# Altium footprint library Miscellaneous Base.PcbLib: 153 footprints (part 1 of 10)
Each footprint in its own frame and in the unit in brackets; x right, y up, seen from the top. Pads: shape width x height; smd on the part's side, far side on the other; paste and mask are expansions set on the pad; w line width, h text height; cw(c..) or ccw(c..) is an arc to the next point about the centre after c.
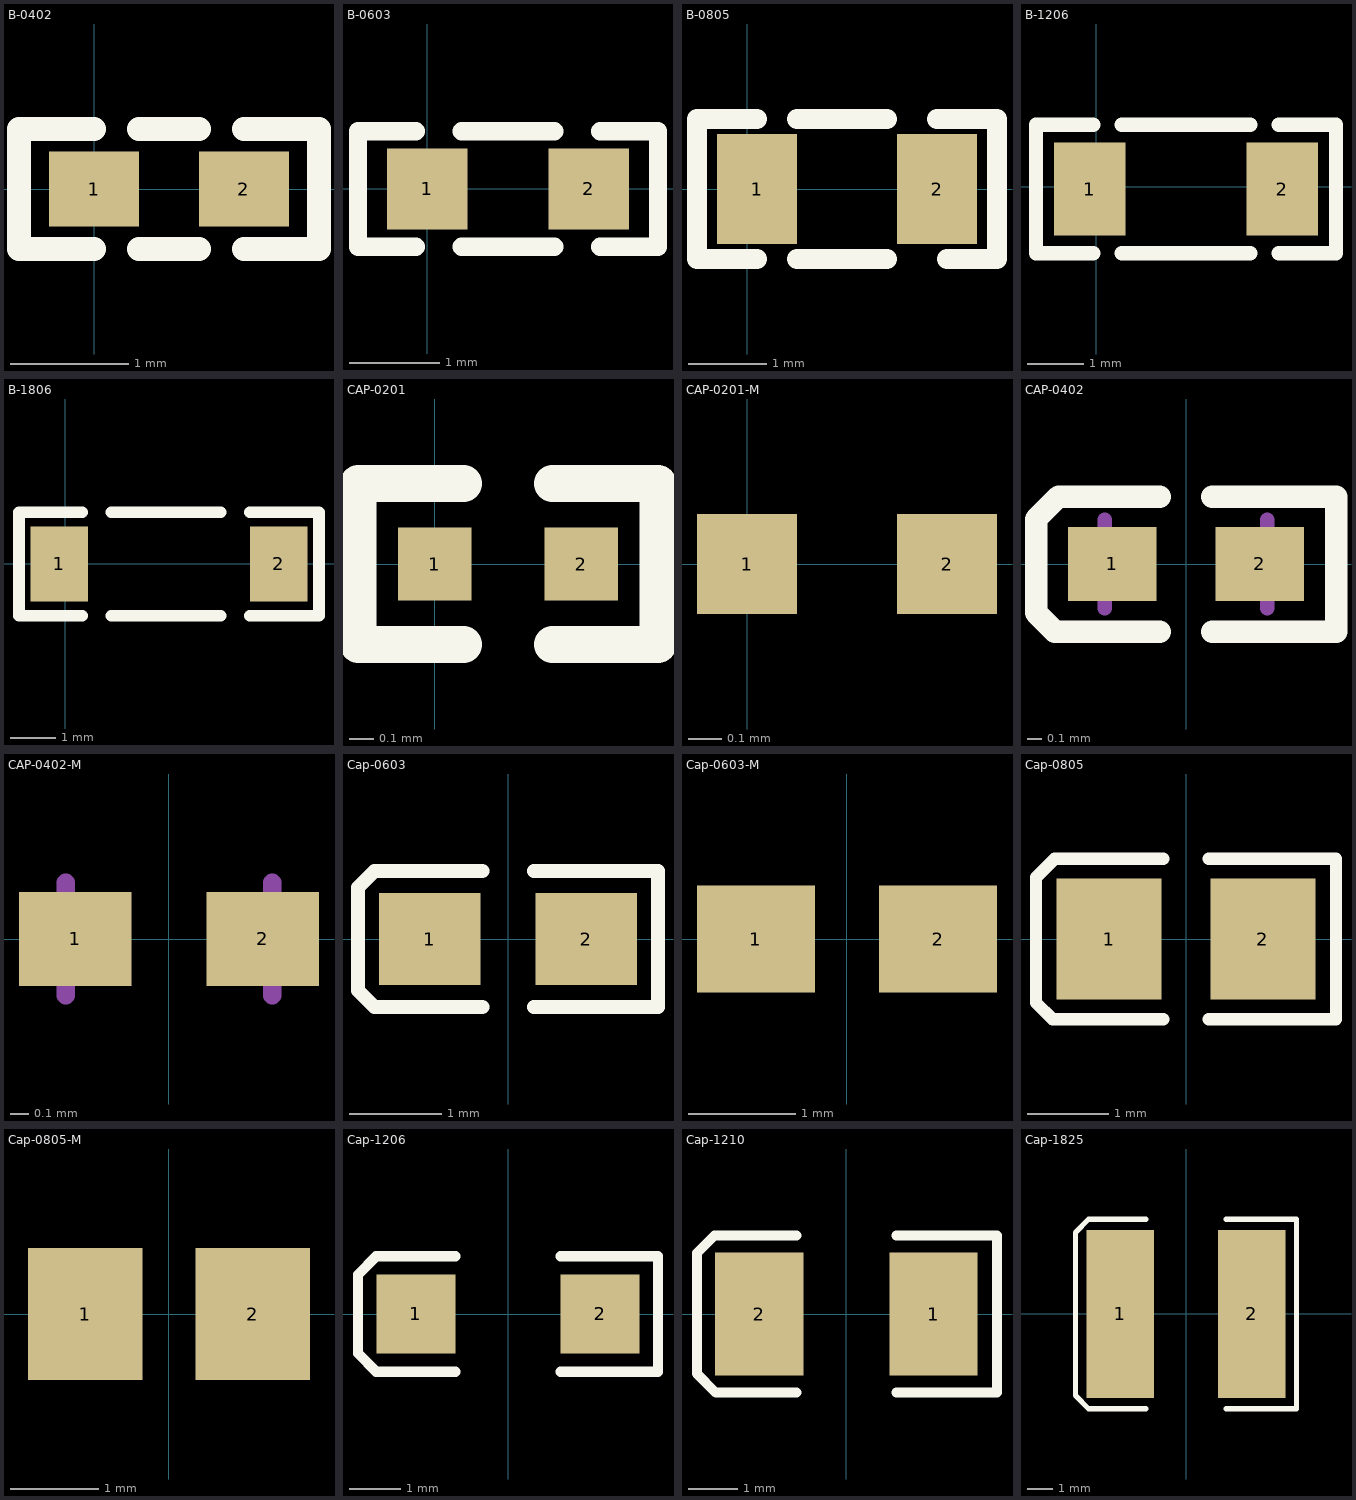
[diagram p0: the footprints below, top view; thin cyan lines are the x and y axes]

## B-0402 [mil] "贴片磁珠"
pads (2):
  rect 30x25 smd: 1(0,0) 2(50,0)
Top Overlay:
  lines w8: 0,-20 -25,-20 -25,20 -15,20 0,20 ; 15,-20 35,-20 ; 15,20 35,20 ; 50,-20 75,-20 75,20 50,20
3D body "ferrite_bead_0402.STEP": height 19.68, standoff 0, extent 5.32,-9.84 44.68,9.84

## B-0603 [mil] "贴片磁珠"
pads (2):
  rect 35x35 smd: 1(0,0) 2(70,0)
Top Overlay:
  lines w8: -5,-25 -30,-25 -30,25 -5,25 ; 15,-25 55,-25 ; 15,25 55,25 ; 75,-25 100,-25 100,25 75,25
3D body "ferrite_bead_0603.STEP": height 31.5, standoff 0, extent 3.5,-15.75 66.5,15.75

## B-0805 [mil] "贴片磁珠"
pads (2):
  rect 40x55 smd: 1(5,0) 2(95,0)
Top Overlay:
  lines w10: 5,-35 -25,-35 -25,35 5,35 ; 25,-35 70,-35 ; 25,35 70,35 ; 95,35 125,35 125,-35 100,-35
3D body "ferrite_bead_0805.STEP": height 35.43, standoff 0, extent 8.13,-23.62 86.87,23.62

## B-1206 [mil] "贴片磁珠"
pads (2):
  rect 50x65 smd: 1(-4.51,-1.5) 2(130.49,-1.5)
Top Overlay:
  lines w10: -2.01,-46.5 -42.01,-46.5 -42.01,43.5 -2.01,43.5 ; 17.99,-46.5 107.99,-46.5 ; 17.99,43.5 107.99,43.5 ; 127.99,-46.5 167.99,-46.5 167.99,43.5 127.99,43.5
3D body "ferrite_bead_1206.STEP": height 43.31, standoff 0, extent 0,-32.99 125.98,30

## B-1806 [mil] "贴片磁珠"
pads (2):
  rect 50x65 smd: 1(-5,0) 2(185,0)
Top Overlay:
  lines w10: 15,-45 -40,-45 -40,45 15,45 ; 40,-45 135,-45 ; 40,45 135,45 ; 160,-45 220,-45 220,-40 220,-15 220,45 160,45
3D body "ferrite_bead_1806.STEP": height 62.99, standoff 0, extent -1.08,-31.5 176.08,31.5

## CAP-0201 [mm]
pads (2):
  rect 0.3x0.3 smd: 1(0,0) 2(0.6,0)
Top Overlay:
  lines w0.152: 0.117,-0.33 -0.314,-0.33 -0.314,0.33 0.117,0.33 ; 0.483,-0.33 0.914,-0.33 0.914,0.33 0.483,0.33
3D body "0201C.STEP": height 0.31, standoff 0, extent 0,-0.152 0.61,0.153

## CAP-0201-M [mm]
pads (2):
  rect 0.3x0.3 smd: 1(0,0) 2(0.6,0)
3D body "0201C.STEP": height 0.31, standoff 0, extent 0,-0.152 0.61,0.153

## CAP-0402 [mm]
height 1.3
pads (2):
  rect 0.6x0.5 smd: 1(-0.5,0) 2(0.5,0)
Top Overlay:
  lines w0.152: -0.178,-0.457 -0.889,-0.457 -1.016,-0.33 -1.016,0.305 -0.864,0.457 -0.178,0.457 ; 0.178,-0.457 1.016,-0.457 1.016,0.457 0.178,0.457
Mechanical 13:
  lines w0.1: -0.55,-0.3 -0.55,0.3 ; 0.55,-0.3 0.55,0.3
3D body "CAPC1005(0402).STEP": height 0.5, standoff 0, extent -0.5,-0.25 0.5,0.25

## CAP-0402-M [mm]
height 1.3
pads (2):
  rect 0.6x0.5 smd: 1(-0.5,0) 2(0.5,0)
Mechanical 13:
  lines w0.1: -0.55,-0.3 -0.55,0.3 ; 0.55,-0.3 0.55,0.3
3D body "CAPC1005(0402).STEP": height 0.5, standoff 0, extent -0.5,-0.25 0.5,0.25

## Cap-0603 [mm]
height 0.6
pads (2):
  rect 1.1x1 smd: 1(-0.85,0) 2(0.85,0)
Top Overlay:
  lines w0.152: -0.279,-0.737 -1.448,-0.737 -1.626,-0.559 -1.626,0.559 -1.448,0.737 -0.279,0.737 ; 0.279,-0.737 1.626,-0.737 1.626,0.737 0.279,0.737
3D body "CAPC1608(0603).STEP": height 0.6, standoff 0, extent -0.8,-0.4 0.8,0.4

## Cap-0603-M [mm]
height 0.6
pads (2):
  rect 1.1x1 smd: 1(-0.85,0) 2(0.85,0)
3D body "CAPC1608(0603).STEP": height 0.6, standoff 0, extent -0.8,-0.4 0.8,0.4

## Cap-0805 [mm]
height 1
pads (2):
  rect 1.3x1.5 smd: 1(-0.95,0) 2(0.95,0)
Top Overlay:
  lines w0.152: -0.279,-0.991 -1.651,-0.991 -1.854,-0.787 -1.854,0.762 -1.626,0.991 -0.279,0.991 ; 0.279,-0.991 1.854,-0.991 1.854,0.991 0.279,0.991
3D body "CAPC2012(0805).STEP": height 0.95, standoff 0, extent -1,-0.6 1,0.6

## Cap-0805-M [mm]
height 1
pads (2):
  rect 1.3x1.5 smd: 1(-0.95,0) 2(0.95,0)
3D body "CAPC2012(0805).STEP": height 0.95, standoff 0, extent -1,-0.6 1,0.6

## Cap-1206 [mil]
height 118.11
pads (2):
  rect 60x60 smd: 1(-70,0) 2(70,0)
Top Overlay:
  lines w7.87: -39.99,-44 -100,-44 -114,-30 -114,30 -100,44 -39.99,44 ; 40.01,-44 114,-44 114,44 40.01,44
3D body "CAPC3216(1206).STEP": height 37.4, standoff 0, extent -62.99,-31.49 63,31.5

## Cap-1210 [mm]
height 3
pads (2):
  rect 1.8x2.5 smd: 1(1.778,0) 2(-1.778,0)
Top Overlay:
  lines w0.2: -1.016,-1.6 -2.667,-1.6 -3.048,-1.219 -3.048,1.245 -2.692,1.6 -1.016,1.6 ; 1.016,-1.6 3.073,-1.6 3.073,1.6 1.016,1.6
3D body "CAPC3225(1210).STEP": height 1.3, standoff 0, extent -1.6,-1.25 1.6,1.25

## Cap-1825 [mm]
pads (2):
  rect 2.6x6.5 smd: 1(-2.54,0) 2(2.54,0)
Top Overlay:
  lines w0.2: -1.549,-3.658 -3.759,-3.658 -4.267,-3.15 -4.267,3.15 -3.759,3.658 -1.549,3.658 ; 1.549,-3.658 4.267,-3.658 4.267,3.657 1.549,3.657
3D body "CAPC4564(1825).STEP": height 1.5, standoff 0, extent -2.25,-3.2 2.25,3.2